# Altium footprint library 14-Inductors.PcbLib: 164 footprints (part 9 of 11)
Each footprint in its own frame and in the unit in brackets; x right, y up, seen from the top. Pads: shape width x height; smd on the part's side, far side on the other; paste and mask are expansions set on the pad; w line width, h text height; cw(c..) or ccw(c..) is an arc to the next point about the centre after c.
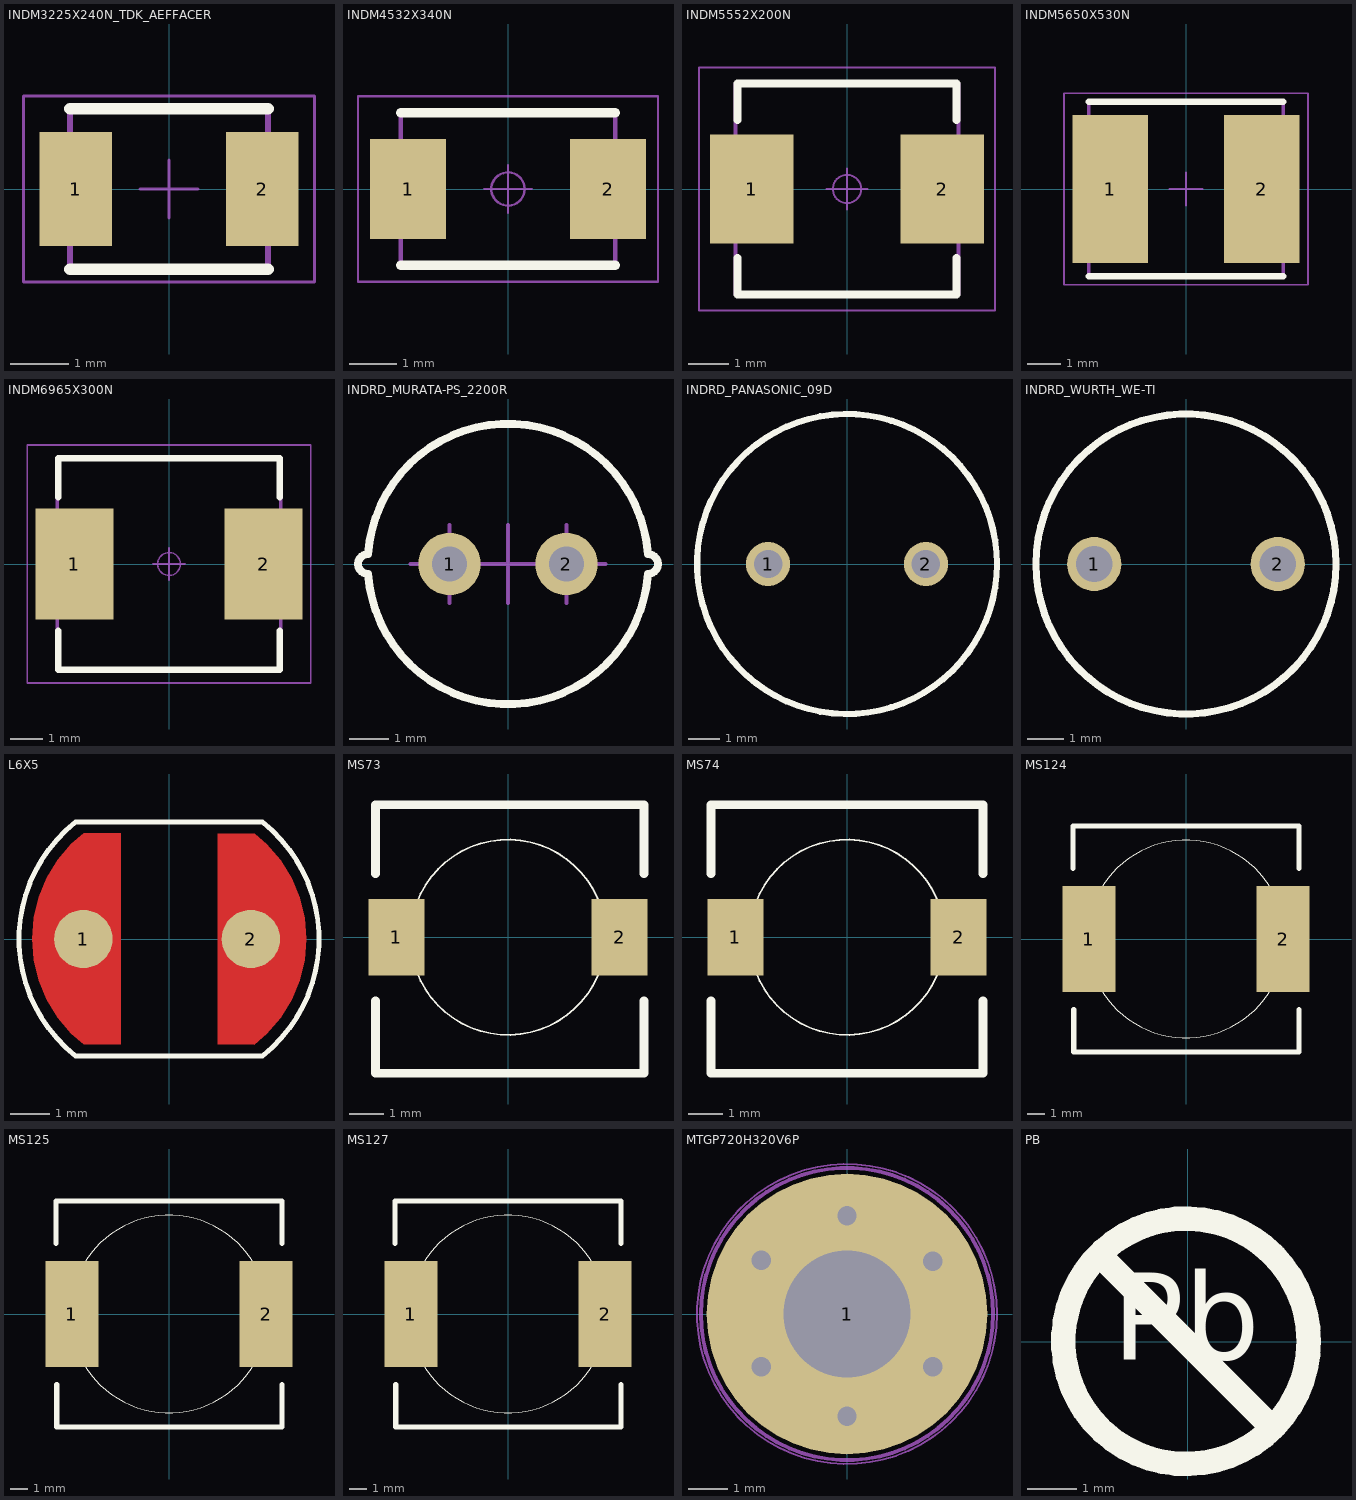
[diagram p8: the footprints below, top view; thin cyan lines are the x and y axes]

## INDM3225X240N_TDK_AEFFACER [mm] "Inductor, Molded Body; 3.20mm L X 2.50mm W, IPC Medium Density"
height 2.4
pads (2):
  rect 1.25x1.95 smd: 1(-1.6,0) 2(1.6,0)
Top Overlay:
  lines w0.2: -1.7,-1.375 1.7,-1.375 ; -1.7,1.375 1.7,1.375
Mechanical 14:
  lines w0.1: -1.7,-1.35 1.7,-1.35 1.7,1.35 -1.7,1.35 -1.7,-1.35
Mechanical 15:
  lines w0.05: -0.5,0 0.5,0 ; 0,-0.5 0,0.5 ; -2.5,-1.6 2.5,-1.6 2.5,1.6 -2.5,1.6 -2.5,-1.6
3D body "INDM3225X240N.stp": height 2.4, standoff 0, extent -1.7,-1.35 1.7,1.35

## INDM4532X340N [mm] "Inductor, Molded Body; 4.5mm L X 3.2mm W, IPC Medium Density"
height 3.4
pads (2):
  rect 1.6x2.1 smd: 1(-2.1,0) 2(2.1,0)
Top Overlay:
  lines w0.2: -2.25,-1.6 2.25,-1.6 ; -2.25,1.6 2.25,1.6
Mechanical 14:
  lines w0.1: -2.25,-1.6 -2.25,1.6 2.25,1.6 2.25,-1.6 -2.25,-1.6
Mechanical 15:
  circle w0.05: c0,0 r0.35
  lines w0.05: -0.5,0 0.5,0 ; 0,-0.5 0,0.5 ; -3.15,-1.95 -3.15,1.95 3.15,1.95 3.15,-1.95 -3.15,-1.95
3D body "INDM4532X340N.stp": height 3.4, standoff 0, extent -2.25,-1.6 2.25,1.6

## INDM5552X200N [mm] "Inductor, Molded Body; 5.49mm L X 5.18mm W X 2.00mm H, IPC Medium Density"
height 2
pads (2):
  rect 2.05x2.7 smd: 1(-2.35,0) 2(2.35,0)
Top Overlay:
  lines w0.2: -2.7,-1.7 -2.7,-2.6 2.7,-2.6 2.7,-1.7 ; -2.7,1.7 -2.7,2.6 2.7,2.6 2.7,1.7
Mechanical 14:
  lines w0.1: -2.745,-2.59 2.745,-2.59 2.745,2.59 -2.745,2.59 -2.745,-2.59
Mechanical 15:
  circle w0.05: c0,0 r0.35
  lines w0.05: -0.5,0 0.5,0 ; 0,-0.5 0,0.5 ; -3.65,-3 3.65,-3 3.65,3 -3.65,3 -3.65,-3
3D body "INDM5552X200N.stp": height 2, standoff 0, extent -2.745,-2.59 2.745,2.59

## INDM5650X530N [mm] "Molded Inductor, 2-Leads, Body 5.6x5.0mm, IPC Medium Density"
height 5.3
pads (2):
  rect 2.3x4.5 smd: 1(-2.3,0) 2(2.3,0)
Top Overlay:
  lines w0.2: -2.95,-2.65 2.95,-2.65 ; -2.95,2.65 2.95,2.65
Mechanical 14:
  lines w0.1: -2.95,-2.65 2.95,-2.65 2.95,2.65 -2.95,2.65 -2.95,-2.65
Mechanical 15:
  lines w0.05: -0.5,0 0.5,0 ; 0,-0.5 0,0.5 ; -3.7,-2.9 3.7,-2.9 3.7,2.9 -3.7,2.9 -3.7,-2.9
3D body "INDM5650X530N.stp": height 5.3, standoff 0, extent -2.95,-2.65 2.85,2.65

## INDM6965X300N [mm] "Inductor Molded Body, Body 6.86mm L X 6.47mm W X 3mm H, IPC Medium Density"
height 3
pads (2):
  rect 2.4x3.4 smd: 1(-2.9,0) 2(2.9,0)
Top Overlay:
  lines w0.2: -3.4,-2.05 -3.4,-3.25 3.4,-3.25 3.4,-2.05 ; -3.4,2.05 -3.4,3.25 3.4,3.25 3.4,2.05
Mechanical 14:
  lines w0.1: -3.43,-3.235 3.43,-3.235 3.43,3.235 -3.43,3.235 -3.43,-3.235
Mechanical 15:
  circle w0.05: c0,0 r0.35
  lines w0.05: -0.5,0 0.5,0 ; 0,-0.5 0,0.5 ; -4.35,-3.65 4.35,-3.65 4.35,3.65 -4.35,3.65 -4.35,-3.65
3D body "INDM_VISHAY_IHLP2525CZ.stp": height 3, standoff 0, extent -3.62,-3.36 3.62,3.36

## INDRD_MURATA-PS_2200R [mm] "Radial Leaded Wire Wound Inductor D=7.7mm"
height 10.5
pads (2):
  round 1.6 hole 0.9: 1(-1.5,0) 2(1.5,0)
Top Overlay:
  lines w0.2: -3.591,-0.25 cw(c-3.6,0) -3.591,0.25 cw(c0,0) 3.591,0.25 cw(c3.6,0) 3.591,-0.25 cw(c0,0) -3.591,-0.25
Mechanical 8:
  lines w0.1: -2.5,0 -1.5,0 ; -1.5,-1 -1.5,0 ; -1.5,1 -1.5,0 ; -1,0 0,0 ; -0.5,0 -1.5,0 ; 0,-1 0,0 ; 0,1 0,0 ; 0.5,0 1.5,0 ; 1,0 0,0 ; 1.5,-1 1.5,0 ; 1.5,1 1.5,0 ; 2.5,0 1.5,0
Mechanical 14:
  lines w0.1: -3.591,-0.25 ccw(c0,0) 3.591,-0.25 ccw(c3.6,0) 3.591,0.25 ccw(c0,0) -3.591,0.25 ccw(c-3.6,0) -3.591,-0.25
3D body "INDRD_MURATA-PS_2200R.stp": height 10.5, standoff -3.3, extent -3.85,-3.6 3.85,3.6

## INDRD_PANASONIC_09D [mm] "Radial Leaded Wire Wound Inductor D=9.5mm"
height 8.9
pads (2):
  round 1.4 hole 0.9: 1(-2.5,0) 2(2.5,0)
Top Overlay:
  circle w0.2: c0,0 r4.75
Mechanical 14:
  circle w0.1: c0,0 r4.75
3D body "IND_PANASONIC_09D.stp": height 8.9, standoff -4.1, extent -4.75,-4.75 4.75,4.75

## INDRD_WURTH_WE-TI [mm] "Radial Leaded Wire Wound Inductor D=8.3mm"
height 10
pads (2):
  round 1.5 hole 1: 1(-2.54,0) 2(2.54,0)
Top Overlay:
  circle w0.2: c0,0 r4.15
Mechanical 14:
  circle w0.1: c0,0 r4.15
3D body "INDRD_WURTH_WE-TI.stp": height 10, standoff -3.6, extent -4.65,-4.65 4.65,4.65

## L6X5 [mm]
height 3.1
pads (2):
  round 1.5 smd: 1(-2.2,0) 2(2.1,0)
Top Layer:
  region: 2.194,-2.705 1.249,-2.705 1.249,2.705 2.197,2.706 2.512,2.437 2.863,2.026 3.146,1.565 3.353,1.065 3.479,0.539 3.522,0 3.479,-0.539 3.353,-1.065 3.146,-1.565 2.863,-2.026 2.512,-2.437 2.192,-2.71
  region: -2.185,2.715 -1.24,2.715 -1.24,-2.695 -2.188,-2.696 -2.503,-2.427 -2.854,-2.016 -3.137,-1.555 -3.344,-1.055 -3.47,-0.529 -3.513,0.01 -3.47,0.549 -3.344,1.075 -3.137,1.575 -2.854,2.036 -2.503,2.447 -2.184,2.72
Top Overlay:
  lines w0.127: -2.4,-3 2.4,-3 ; -2.4,3 2.4,3 ; -2.4,-3 cw(c-0.022,0) -2.4,3 ; 2.4,-3 ccw(c0.022,0) 2.4,3
3D body "IND_BOURNS_PM43.stp": height 3.5, standoff 0, extent -2.381,-2.15 2.381,2.15

## MS73 [mm]
height 3.1
pads (2):
  rect 1.6x2.2 smd: 1(-3.2,0) 2(3.2,0)
Top Overlay:
  circle w0.051: c0,0 r2.8
  lines w0.254: -3.8,-1.825 -3.8,-3.9 3.9,-3.9 3.9,-1.825 ; -3.8,1.825 -3.8,3.8 3.9,3.8 3.9,1.825
3D body "ms73.stp": height 3.3, standoff -0.2, extent -3.6,-3.7 3.7,3.6

## MS74 [mm]
height 3.1
pads (2):
  rect 1.6x2.2 smd: 1(-3.2,0) 2(3.2,0)
Top Overlay:
  circle w0.051: c0,0 r2.8
  lines w0.254: -3.9,-1.825 -3.9,-3.9 3.9,-3.9 3.9,-1.825 ; -3.9,1.825 -3.9,3.8 3.9,3.8 3.9,1.825
3D body "ms74.stp": height 4.4, standoff -0.2, extent -3.65,-3.7 3.65,3.6

## MS124 [mm]
height 3.1
pads (2):
  rect 3x6 smd: 1(-5.5,0) 2(5.5,0)
Top Overlay:
  circle w0.051: c0,0 r5.601
  lines w0.3: -6.4,4 -6.4,6.4 6.4,6.4 6.4,4 ; -6.36,-4 -6.36,-6.4 6.4,-6.4 6.4,-4
3D body "ms124.stp": height 5, standoff -0.3, extent -6,-6 6,6

## MS125 [mm]
height 3.1
pads (2):
  rect 3x6 smd: 1(-5.5,0) 2(5.5,0)
Top Overlay:
  circle w0.051: c0,0 r5.601
  lines w0.3: -6.4,4 -6.4,6.4 6.4,6.4 6.4,4 ; -6.36,-4 -6.36,-6.4 6.4,-6.4 6.4,-4
3D body "ms125.stp": height 5.95, standoff -0.3, extent -6,-6.1 6,5.9
3D body "6-3-ms125.stp": height 0.02, standoff 0, extent 4,-3 7,3
3D body "6-3-ms125.stp": height 0.02, standoff 0, extent -7,-3 -4,3

## MS127 [mm]
height 3.1
pads (2):
  rect 3x6 smd: 1(-5.5,0) 2(5.5,0)
Top Overlay:
  circle w0.051: c0,0 r5.601
  lines w0.3: -6.4,4 -6.4,6.4 6.4,6.4 6.4,4 ; -6.36,-4 -6.36,-6.4 6.4,-6.4 6.4,-4
3D body "ms128.stp": height 8, standoff -0.3, extent -6,-6 6,6

## MTGP720H320V6P [mm]
pads (1):
  round 7.2 hole 3.25: 1(0,0)
via 2.2,-1.35 diameter 1 hole 0.5
via 0,-2.625 diameter 1 hole 0.5
via 2.2,1.35 diameter 1 hole 0.5
via 0,2.525 diameter 1 hole 0.5
via -2.2,1.375 diameter 1 hole 0.5
via -2.2,-1.35 diameter 1 hole 0.5
Mechanical 8:
  circle w0.1: c0,0 r3.75
  circle w0.1: c0,0 r2.6
  lines w0.1: -2.657,1.625 -2.224,1.375 ; -2.632,-1.6 -2.199,-1.35 ; -2.474,0.942 -2.224,1.375 ; -2.449,-0.917 -2.199,-1.35 ; -1.974,1.808 -2.224,1.375 ; -1.949,-1.783 -2.199,-1.35 ; -1.791,1.125 -2.224,1.375 ; -1.766,-1.1 -2.199,-1.35 ; -0.5,-2.625 0,-2.625 ; -0.5,0 0,0 ; -0.5,2.525 0,2.525 ; 0,-3.125 0,-2.625 ; 0,-2.125 0,-2.625 ; 0,-0.5 0,0 ; 0,0.5 0,0 ; 0,2.025 0,2.525 ; 0,3.025 0,2.525 ; 0.5,-2.625 0,-2.625 ; 0.5,0 0,0 ; 0.5,2.525 0,2.525 ; 1.766,-1.1 2.199,-1.35 ; 1.766,1.1 2.199,1.35 ; 1.949,-1.783 2.199,-1.35 ; 1.949,1.783 2.199,1.35 ; 2.449,-0.917 2.199,-1.35 ; 2.449,0.917 2.199,1.35 ; 2.632,-1.6 2.199,-1.35 ; 2.632,1.6 2.199,1.35
Mechanical 14:
  circle w0.1: c0,0 r3.75
Mechanical 15:
  circle w0.05: c0,0 r3.85
3D body "mtgp720h320v6p.stp": height 0.1, standoff -1.75, extent -3.627,-3.627 3.628,3.628

## PB [mm]
Top Overlay:
  circle w0.5: c-0.031,0.013 r2.5
  lines w0.5: -1.737,1.719 1.675,-1.693
  text "Pb" at -1.536,-0.948 h3.05
3D body "pb.stp": height 0.02, standoff 0, extent -2.725,-2.725 2.725,2.725